# Altium footprint library FootprintsOld.PcbLib: 93 footprints (part 4 of 6)
Each footprint in its own frame and in the unit in brackets; x right, y up, seen from the top. Pads: shape width x height; smd on the part's side, far side on the other; paste and mask are expansions set on the pad; w line width, h text height; cw(c..) or ccw(c..) is an arc to the next point about the centre after c.
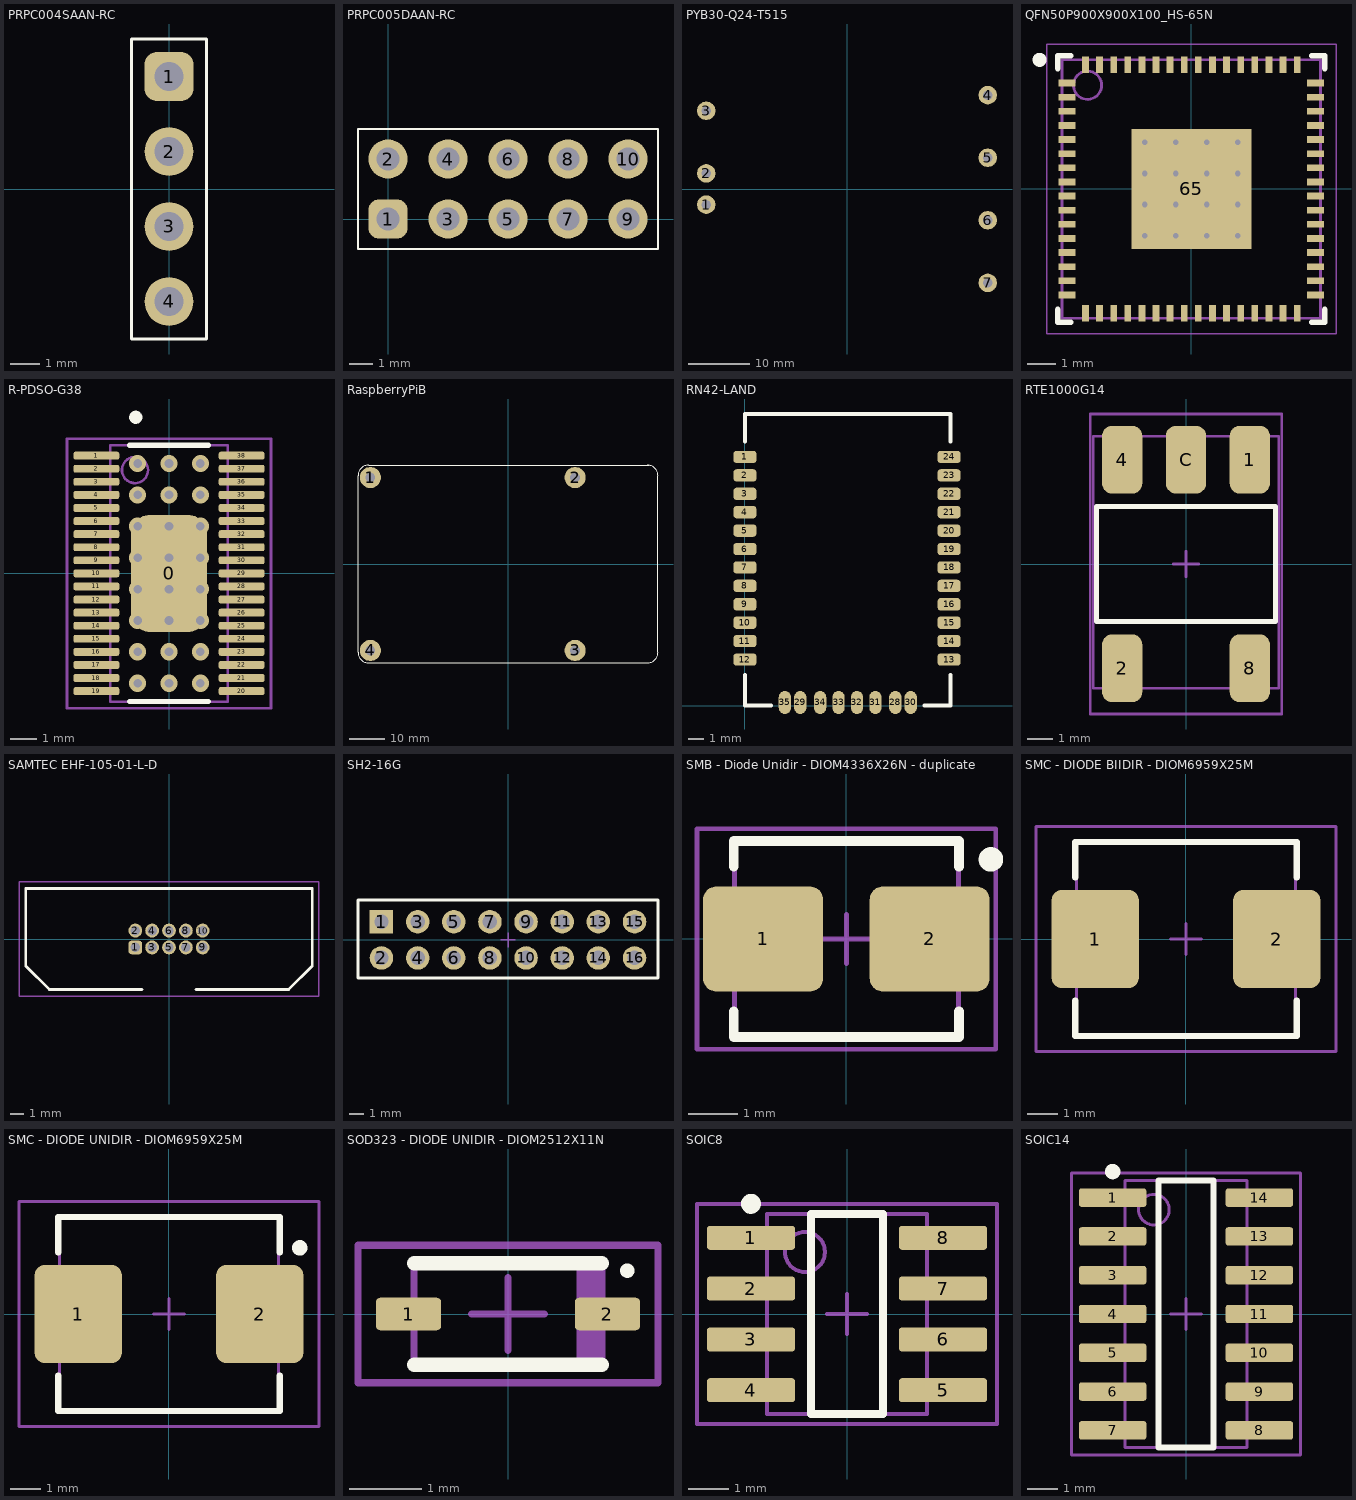
[diagram p3: the footprints below, top view; thin cyan lines are the x and y axes]

## PRPC004SAAN-RC [mil]
pads (4):
  rrect50% 65x65 hole 39: 1(0,150)
  round 65 hole 39: 2(0,50) 3(0,-50) 4(0,-150)
Top Overlay:
  lines w3.94: -50,-200 50,-200 50,200 -50,200 -50,-200
3D body "mill-max-350-10-103-00-006000.STEP": height 252, standoff -142, extent -50,-100 50,200

## PRPC005DAAN-RC [mil]
pads (10):
  rrect50% 65x65 hole 39: 1(0,0)
  round 65 hole 39: 2(0,100) 3(100,0) 4(100,100) 5(200,0) 6(200,100) 7(300,0) 8(300,100) 9(400,0) 10(400,100)
Top Overlay:
  lines w3.94: -50,-50 450,-50 450,150 -50,150 -50,-50
3D body "Ensamblaje1.STEP": height 250.28, standoff -143.72, extent -50,-50 450,150

## PYB30-Q24-T515 [mm] "DC/DC CONVERTER 5V +/-15V 30W"
pads (7):
  round 3 hole 1.5: 1(-22.86,-2.54) 2(-22.86,2.54) 3(-22.86,12.7) 4(22.86,15.24) 5(22.86,5.08) 6(22.86,-5.08) 7(22.86,-15.24)
3D body "PYB30-Q24-T515 .STEP": height 11.8, standoff -2, extent -25.4,-20.3 25.4,20.3

## QFN50P900X900X100_HS-65N [mm] "QFN, 64-Leads, Body 9,00x9,00mm, Pitch 0,50mm, Thermal Pad 4,25x4,25mm, IPC Medium Density"
height 1
pads (65):
  rect 0.6x0.24 smd: 1(-4.4,3.75) 2(-4.4,3.25) 3(-4.4,2.75) 4(-4.4,2.25) 5(-4.4,1.75) 6(-4.4,1.25) 7(-4.4,0.75) 8(-4.4,0.25) 9(-4.4,-0.25) 10(-4.4,-0.75) 11(-4.4,-1.25) 12(-4.4,-1.75) 13(-4.4,-2.25) 14(-4.4,-2.75) 15(-4.4,-3.25) 16(-4.4,-3.75) 33(4.4,-3.75) 34(4.4,-3.25) 35(4.4,-2.75) 36(4.4,-2.25) 37(4.4,-1.75) 38(4.4,-1.25) 39(4.4,-0.75) 40(4.4,-0.25) 41(4.4,0.25) 42(4.4,0.75) 43(4.4,1.25) 44(4.4,1.75) 45(4.4,2.25) 46(4.4,2.75) 47(4.4,3.25) 48(4.4,3.75)
  rect 0.24x0.6 smd: 17(-3.75,-4.4) 18(-3.25,-4.4) 19(-2.75,-4.4) 20(-2.25,-4.4) 21(-1.75,-4.4) 22(-1.25,-4.4) 23(-0.75,-4.4) 24(-0.25,-4.4) 25(0.25,-4.4) 26(0.75,-4.4) 27(1.25,-4.4) 28(1.75,-4.4) 29(2.25,-4.4) 30(2.75,-4.4) 31(3.25,-4.4) 32(3.75,-4.4) 49(3.75,4.4) 50(3.25,4.4) 51(2.75,4.4) 52(2.25,4.4) 53(1.75,4.4) 54(1.25,4.4) 55(0.75,4.4) 56(0.25,4.4) 57(-0.25,4.4) 58(-0.75,4.4) 59(-1.25,4.4) 60(-1.75,4.4) 61(-2.25,4.4) 62(-2.75,4.4) 63(-3.25,4.4) 64(-3.75,4.4)
  rect 4.25x4.25 smd: 65(0,0)
via -1.65,1.65 diameter 0.5 hole 0.2
via -0.55,1.65 diameter 0.5 hole 0.2
via 0.55,1.65 diameter 0.5 hole 0.2
via 1.65,1.65 diameter 0.5 hole 0.2
via -1.65,0.55 diameter 0.5 hole 0.2
via -0.55,0.55 diameter 0.5 hole 0.2
via 0.55,0.55 diameter 0.5 hole 0.2
via 1.65,0.55 diameter 0.5 hole 0.2
via -1.65,-0.55 diameter 0.5 hole 0.2
via -0.55,-0.55 diameter 0.5 hole 0.2
via 0.55,-0.55 diameter 0.5 hole 0.2
via 1.65,-0.55 diameter 0.5 hole 0.2
via -1.65,-1.65 diameter 0.5 hole 0.2
via -0.55,-1.65 diameter 0.5 hole 0.2
via 0.55,-1.65 diameter 0.5 hole 0.2
via 1.65,-1.65 diameter 0.5 hole 0.2
Top Overlay:
  circle w0.25: c-5.375,4.575 r0.125
  lines w0.2: -4.725,-4.27 -4.725,-4.725 -4.27,-4.725 ; -4.725,4.27 -4.725,4.725 -4.27,4.725 ; 4.27,-4.725 4.725,-4.725 4.725,-4.27 ; 4.27,4.725 4.725,4.725 4.725,4.27
Top Assembly:
  circle w0.1: c-3.675,3.675 r0.5
  lines w0.1: -4.575,-4.575 -4.575,4.575 4.575,4.575 4.575,-4.575 -4.575,-4.575
Courtyard Top (Mech10):
  lines w0.05: -5.125,-5.125 -5.125,5.125 5.125,5.125 5.125,-5.125 -5.125,-5.125
  lines w0.1: -0.5,0 0.5,0 ; 0,-0.5 0,0.5
3D body "QFN50P900X900X100_HS-65N.step": height 1, standoff 0, extent -4.576,-4.576 4.576,4.576

## R-PDSO-G38 [mm] "PowerPAD Plastic Small-Outline Package"
height 1.2
pads (39):
  rrect50% 2.9x4.48 smd: 0(0,0)
  rrect50% 1.75x0.3 smd mask+0.05: 1(-2.775,4.5) 2(-2.775,4) 3(-2.775,3.5) 4(-2.775,3) 5(-2.775,2.5) 6(-2.775,2) 7(-2.775,1.5) 8(-2.775,1) 9(-2.775,0.5) 10(-2.775,0) 11(-2.775,-0.5) 12(-2.775,-1) 13(-2.775,-1.5) 14(-2.775,-2) 15(-2.775,-2.5) 16(-2.775,-3) 17(-2.775,-3.5) 18(-2.775,-4) 19(-2.775,-4.5) 20(2.775,-4.5) 21(2.775,-4) 22(2.775,-3.5) 23(2.775,-3) 24(2.775,-2.5) 25(2.775,-2) 26(2.775,-1.5) 27(2.775,-1) 28(2.775,-0.5) 29(2.775,0) 30(2.775,0.5) 31(2.775,1) 32(2.775,1.5) 33(2.775,2) 34(2.775,2.5) 35(2.775,3) 36(2.775,3.5) 37(2.775,4) 38(2.775,4.5)
via -1.2,1.8 diameter 0.66 hole 0.33
via 0,1.8 diameter 0.66 hole 0.33
via 1.2,1.8 diameter 0.66 hole 0.33
via -1.2,0.6 diameter 0.66 hole 0.33
via 0,0.6 diameter 0.66 hole 0.33
via 1.2,0.6 diameter 0.66 hole 0.33
via -1.2,-0.6 diameter 0.66 hole 0.33
via 0,-0.6 diameter 0.66 hole 0.33
via 1.2,-0.6 diameter 0.66 hole 0.33
via -1.2,-1.8 diameter 0.66 hole 0.33
via 0,-1.8 diameter 0.66 hole 0.33
via 1.2,-1.8 diameter 0.66 hole 0.33
via 1.2,3 diameter 0.66 hole 0.33
via 0,3 diameter 0.66 hole 0.33
via -1.2,3 diameter 0.66 hole 0.33
via 1.2,4.2 diameter 0.66 hole 0.33
via 0,4.2 diameter 0.66 hole 0.33
via -1.2,4.2 diameter 0.66 hole 0.33
via 1.2,-4.2 diameter 0.66 hole 0.33
via 0,-4.2 diameter 0.66 hole 0.33
via -1.2,-4.2 diameter 0.66 hole 0.33
via 1.2,-3 diameter 0.66 hole 0.33
via 0,-3 diameter 0.66 hole 0.33
via -1.2,-3 diameter 0.66 hole 0.33
Top Overlay:
  circle w0.25: c-1.27,5.967 r0.125
  lines w0.2: -1.5,-4.9 1.5,-4.9 ; -1.5,4.9 1.5,4.9
Top Assembly (Mech13):
  circle w0.1: c-1.3,3.95 r0.5
  lines w0.1: -2.25,-4.9 -2.25,4.9 2.25,4.9 2.25,-4.9 -2.25,-4.9
Top Courtyard:
  lines w0.1: -0.5,0 0.5,0 ; 0,-0.5 0,0.5 ; -3.9,-5.15 -3.9,5.15 3.9,5.15 3.9,-5.15 -3.9,-5.15
3D body: height 1.2, standoff 0.25, extent -2.25,-4.9 2.25,4.9

## RaspberryPiB [mm]
pads (4):
  round 6 hole 2.75: 1(-39,24.5) 2(19,24.5) 3(19,-24.5) 4(-39,-24.5)
Top Overlay:
  lines w0.254: 39.5,28 cw(c39.5,25) 42.5,25 42.5,0 42.5,-25 cw(c39.5,-25) 39.5,-28 -39.5,-28 cw(c-39.5,-25) -42.5,-25 -42.5,0 -42.5,25 cw(c-39.5,25) -39.5,28 40,28
3D body "RaspberryPiB.STEP": height 27.47, standoff 0.03, extent -42.5,-29.311 44.872,28

## RN42-LAND [mm] "RN42 Footprint"
height 2.1
pads (32):
  rrect50% 1.5x0.8 smd: 1(0,16.2) 2(0,15) 3(0,13.8) 4(0,12.6) 5(0,11.4) 6(0,10.2) 7(0,9) 8(0,7.8) 9(0,6.6) 10(0,5.4) 11(0,4.2) 12(0,3) 13(13.3,3) 14(13.3,4.2) 15(13.3,5.4) 16(13.3,6.6) 17(13.3,7.8) 18(13.3,9) 19(13.3,10.2) 20(13.3,11.4) 21(13.3,12.6) 22(13.3,13.8) 23(13.3,15) 24(13.3,16.2)
  oval 0.8x1.5 smd: 28(9.8,0.2) 29(3.6,0.2) 30(10.8,0.2) 31(8.5,0.2) 32(7.3,0.2) 33(6.1,0.2) 34(4.9,0.2) 35(2.6,0.2)
Top Overlay:
  lines w0.254: 0,2 0,0 1.7,0 ; 0,17.2 0,19 13.4,19 13.4,17.2 ; 11.7,0 13.4,0 13.4,2
3D body "User Library-RN42.STEP": height 2.21, standoff 0.01, extent 0.011,0.206 13.411,26.006

## RTE1000G14 [mm] "SWITCH ROTARY DIP BCD"
pads (5):
  rrect50% 1.6x2.7 smd: 1(2.54,4.15) 2(-2.54,-4.15) 4(-2.54,4.15) 8(2.54,-4.15) C(0,4.15)
Top Overlay:
  lines w0.2: -3.556,-2.286 -3.556,2.286 3.556,2.286 3.556,-2.286 -3.556,-2.286
Top Assembly (Mech13):
  lines w0.1: -3.683,-4.953 3.683,-4.953 3.683,5.08 -3.683,5.08 -3.683,-4.953
Top Courtyard:
  lines w0.1: -0.5,0 0.5,0 ; 0,-0.5 0,0.5 ; -3.81,-5.969 3.81,-5.969 3.81,5.969 -3.81,5.969 -3.81,-5.969
3D body "User Library-RTE1000G.STEP": height 4.25, standoff 0, extent -3.7,-5 3.7,5

## SAMTEC EHF-105-01-L-D [mil]
pads (10):
  rrect50% 41x41 hole 28 mask+5: 1(-100,-25)
  round 41 hole 28 mask+5: 2(-100,25) 3(-50,-25) 4(-50,25) 5(0,-25) 6(0,25) 7(50,-25) 8(50,25) 9(100,-25) 10(100,25)
Top Overlay:
  lines w7.87: -80,-150 -355,-150 -425,-80 -425,150 -85,150 425,150 425,-80 355,-150 80,-150
Top Courtyard:
  lines w3.94: -445,-170 445,-170 445,170 -445,170 -445,-170
3D body "EHF-105-01-L-D.STEP": height 451.79, standoff -100.21, extent -409.99,-131.24 410.01,131.26

## SH2-16G [mil]
pads (16):
  rect 65x65 hole 40: 1(-350,50)
  round 65 hole 40: 2(-350,-50) 3(-250,50) 4(-250,-50) 5(-150,50) 6(-150,-50) 7(-50,50) 8(-50,-50) 9(50,50) 10(50,-50) 11(150,50) 12(150,-50) 13(250,50) 14(250,-50) 15(350,50) 16(350,-50)
Top Overlay:
  lines w7.87: -415,-105 415,-105 415,110 -415,110 -415,-105
Top Assembly (Mech13):
  lines w3.94: -415,-105 -415,110 415,110 415,-105
Top Courtyard:
  lines w3.94: -415,-105 -415,110 415,110 415,-105 ; -19.69,0 19.68,0 ; 0,-19.68 0,19.68

## SMB - Diode Unidir - DIOM4336X26N - duplicate [mm] "Molded Diode, 2-Leads, Body 4.3x3.6mm, IPC Medium Density"
height 2.62
pads (2):
  rrect25% 2.45x2.15 smd: 1(-1.7,0) 2(1.7,0)
Top Overlay:
  circle w0.25: c2.95,1.625 r0.125
  lines w0.2: -2.3,-1.475 -2.3,-2 2.3,-2 2.3,-1.475 ; -2.3,1.475 -2.3,2 2.3,2 2.3,1.475
Top Assembly (Mech13):
  lines w0.1: -2.285,-1.97 2.285,-1.97 2.285,1.97 -2.285,1.97 -2.285,-1.97
Top Courtyard:
  lines w0.1: -0.5,0 0.5,0 ; 0,-0.5 0,0.5 ; -3.05,-2.25 3.05,-2.25 3.05,2.25 -3.05,2.25 -3.05,-2.25
3D body "SMB - Diode Unidir - DIOM4336X26N.STEP": height 2.3, standoff 0, extent -2.7,-1.8 2.7,1.8

## SMC - DIODE BIIDIR - DIOM6959X25M [mm] "Molded Diode, 2-Leads, Body 6,9x5,9mm, IPC Low Density"
height 2.5
pads (2):
  rrect25% 2.85x3.2 smd: 1(-2.95,0) 2(2.95,0)
Top Overlay:
  lines w0.2: -3.6,-2 -3.6,-3.15 3.6,-3.15 3.6,-2 ; -3.6,2 -3.6,3.15 3.6,3.15 3.6,2
Top Assembly (Mech13):
  lines w0.1: -3.555,-3.11 -3.555,3.11 3.555,3.11 3.555,-3.11 -3.555,-3.11
Top Courtyard:
  lines w0.1: -0.5,0 0.5,0 ; 0,-0.5 0,0.5 ; -4.875,-3.65 -4.875,3.65 4.875,3.65 4.875,-3.65 -4.875,-3.65
3D body "SMC - DIODE UNIDIR - DIOM6959X25M.STEP": height 2.3, standoff 0, extent -3.95,-2.95 4,2.95

## SMC - DIODE UNIDIR - DIOM6959X25M [mm] "Molded Diode, 2-Leads, Body 6,9x5,9mm, IPC Low Density"
height 2.5
pads (2):
  rrect25% 2.85x3.2 smd: 1(-2.95,0) 2(2.95,0)
Top Overlay:
  circle w0.25: c4.25,2.15 r0.125
  lines w0.2: -3.6,-2 -3.6,-3.15 3.6,-3.15 3.6,-2 ; -3.6,2 -3.6,3.15 3.6,3.15 3.6,2
Top Assembly (Mech13):
  lines w0.1: -3.555,-3.11 -3.555,3.11 3.555,3.11 3.555,-3.11 -3.555,-3.11
Top Courtyard:
  lines w0.1: -0.5,0 0.5,0 ; 0,-0.5 0,0.5 ; -4.875,-3.65 -4.875,3.65 4.875,3.65 4.875,-3.65 -4.875,-3.65
3D body "SMC - DIODE UNIDIR - DIOM6959X25M.STEP": height 2.3, standoff 0, extent -3.95,-2.95 4,2.95

## SOD323 - DIODE UNIDIR - DIOM2512X11N [mm] "Molded Diode, 2-Leads, Body 2.5x1.3mm, IPC Medium Density"
height 1.1
pads (2):
  rrect25% 0.9x0.45 smd: 1(-1.375,0) 2(1.375,0)
Top Overlay:
  circle w0.1: c1.65,0.6 r0.05
  lines w0.2: -1.3,-0.7 1.3,-0.7 ; -1.3,0.7 1.3,0.7
Top Assembly (Mech13):
  rectangle: 0.951,-0.675 1.301,0.675
  lines w0.1: -1.3,-0.675 1.3,-0.675 1.3,0.675 -1.3,0.675 -1.3,-0.675
Top Courtyard:
  lines w0.1: -0.5,0 0.5,0 ; 0,-0.5 0,0.5 ; -2.075,-0.95 2.075,-0.95 2.075,0.95 -2.075,0.95 -2.075,-0.95
3D body "SOD323 - DIODE UNIDIR - DIOM2512X11N.STEP": height 1.1, standoff 0, extent -1.3,-0.675 1.3,0.675

## SOIC8 [mm] "SOIC, 8-Leads, Body 5.0x4.0mm (max), Pitch 1.27mm, IPC Medium Density"
height 1.75
pads (8):
  rrect25% 2.2x0.6 smd: 1(-2.4,1.905) 2(-2.4,0.635) 3(-2.4,-0.635) 4(-2.4,-1.905) 5(2.4,-1.905) 6(2.4,-0.635) 7(2.4,0.635) 8(2.4,1.905)
Top Overlay:
  circle w0.25: c-2.4,2.755 r0.125
  lines w0.2: -0.9,-2.5 0.9,-2.5 0.9,2.5 -0.9,2.5 -0.9,-2.5
Top Assembly (Mech13):
  circle w0.1: c-1.05,1.55 r0.5
  lines w0.1: -2,-2.5 2,-2.5 2,2.5 -2,2.5 -2,-2.5
Top Courtyard:
  lines w0.1: -0.5,0 0.5,0 ; 0,-0.5 0,0.5 ; -3.75,-2.75 3.75,-2.75 3.75,2.75 -3.75,2.75 -3.75,-2.75
3D body "SOIC NARROW 8 - SOIC127P600X175-8N.STEP": height 2.3, standoff -0.02, extent -3.106,-2.68 3.106,2.7

## SOIC14 [mm] "SOIC, 14-Leads, Body 10.0x4.0mm (max), Pitch 1.27mm, IPC Medium Density"
height 1.75
pads (14):
  rrect25% 2.2x0.6 smd: 1(-2.4,3.81) 2(-2.4,2.54) 3(-2.4,1.27) 4(-2.4,0) 5(-2.4,-1.27) 6(-2.4,-2.54) 7(-2.4,-3.81) 8(2.4,-3.81) 9(2.4,-2.54) 10(2.4,-1.27) 11(2.4,0) 12(2.4,1.27) 13(2.4,2.54) 14(2.4,3.81)
Top Overlay:
  circle w0.25: c-2.4,4.66 r0.125
  lines w0.2: -0.9,-4.365 -0.9,4.365 0.9,4.365 0.9,-4.365 -0.9,-4.365
Top Assembly (Mech13):
  circle w0.1: c-1.05,3.415 r0.5
  lines w0.1: -2,-4.365 -2,4.365 2,4.365 2,-4.365 -2,-4.365
Top Courtyard:
  lines w0.1: -0.5,0 0.5,0 ; 0,-0.5 0,0.5 ; -3.75,-4.615 -3.75,4.615 3.75,4.615 3.75,-4.615 -3.75,-4.615
3D body "SOIC14.STEP": height 1.75, standoff 0, extent -2.9,-4.275 2.9,4.275